# Altium footprint library Connectors.PcbLib: 67 footprints (part 1 of 5)
Each footprint in its own frame and in the unit in brackets; x right, y up, seen from the top. Pads: shape width x height; smd on the part's side, far side on the other; paste and mask are expansions set on the pad; w line width, h text height; cw(c..) or ccw(c..) is an arc to the next point about the centre after c.
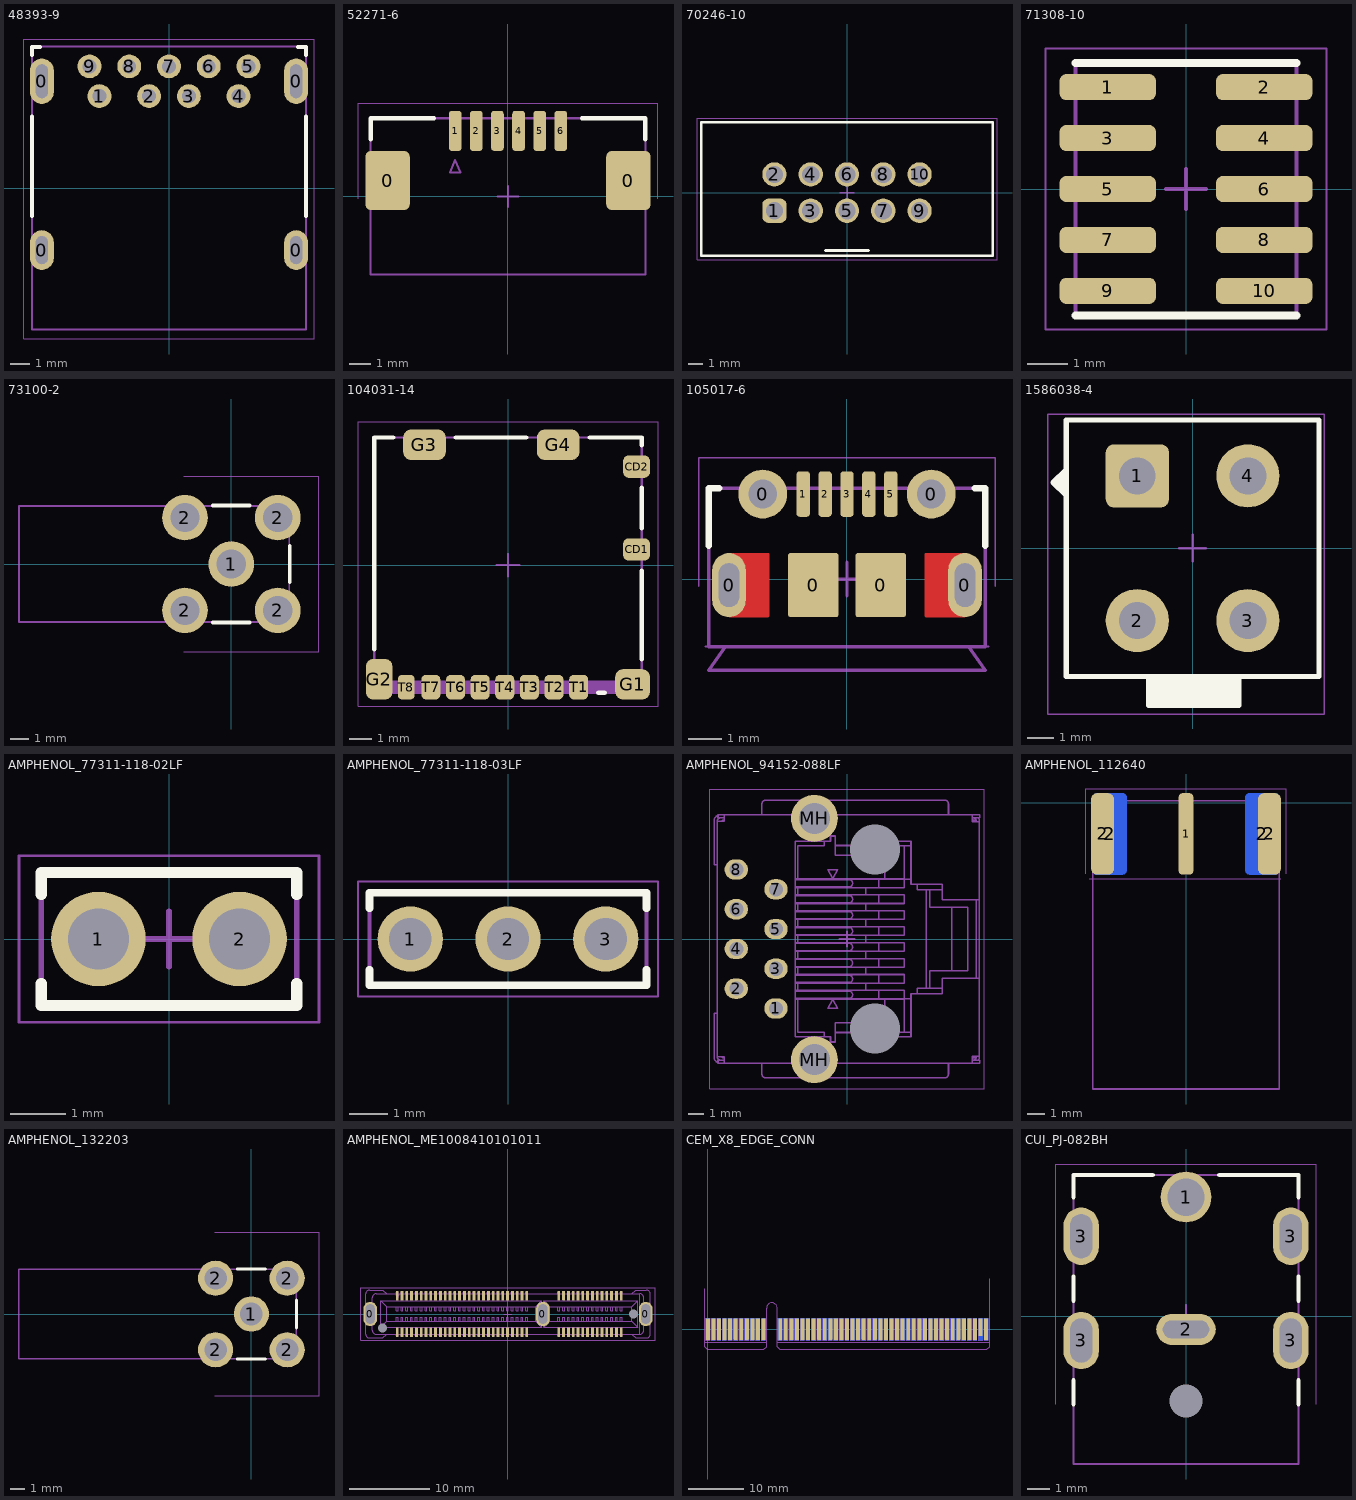
[diagram p0: the footprints below, top view; thin cyan lines are the x and y axes]

## 48393-9 [mm]
height 6.86
pads (13):
  oval 1.2x2 hole 1.4 slot 0.6 at 0 deg mask+0.05: 0(-6.4,-3.125) 0(6.4,-3.125)
  oval 1.2x2.3 hole 1.7 slot 0.6 at 0 deg mask+0.05: 0(-6.4,5.375) 0(6.4,5.375)
  round 1.2 hole 0.7 mask+0.05: 1(-3.5,4.625) 2(-1,4.625) 3(1,4.625) 4(3.5,4.625) 5(4,6.125) 6(2,6.125) 7(0,6.125) 8(-2,6.125) 9(-4,6.125)
Top Overlay:
  lines w0.2: -6.9,-1.4 -6.9,3.6 ; -6.9,6.7 -6.9,7.1 -6.5,7.1 ; 6.5,7.1 6.9,7.1 6.9,6.7 ; 6.9,-1.4 6.9,3.6
Top Assembly:
  lines w0.1: -6.9,-7.125 -6.9,7.125 6.9,7.125 6.9,-7.125 -6.9,-7.125
  text ".Designator" at -5.835,-0.571 h1.6
Top Courtyard (Mech13):
  lines w0.05: -7.3,-7.6 7.3,-7.6 7.3,7.5 -7.3,7.5 -7.3,-7.6
3D body "123.stp": height 6.5, standoff -1.54, extent -6.9,-7.125 6.9,7.125

## 52271-6 [mm]
height 3
pads (8):
  rrect25% 2.1x2.8 smd mask+0.05: 0(-5.7,0.75) 0(5.7,0.75)
  rrect50% 0.6x1.9 smd mask+0.05: 1(-2.5,3.1) 2(-1.5,3.1) 3(-0.5,3.1) 4(0.5,3.1) 5(1.5,3.1) 6(2.5,3.1)
Top Overlay:
  lines w0.2: -6.5,2.7 -6.5,3.7 -3.5,3.7 ; 3.5,3.7 6.5,3.7 6.5,2.7
Top Assembly:
  lines w0.1: -6.5,-3.7 6.5,-3.7 6.5,3.7 -6.5,3.7 -6.5,-3.7 ; -2.75,1.125 -2.5,1.725 -2.25,1.125 -2.75,1.125
  text ".Designator" at -5.835,-0.571 h1.6
Top Courtyard (Mech13):
  lines w0.05: -7.1,-0.1 -7.1,4.4 7.1,4.4 7.1,-0.1
  lines w0.1: -0.5,0 0.5,0 ; 0,-0.5 0,0.5
3D body "522710679.stp": height 3, standoff 0, extent -6.5,-3.7 6.5,3.7

## 70246-10 [mm]
height 6.1
pads (10):
  rrect50% 1.7x1.7 hole 1.2 mask+0.05: 1(-5.08,-1.27)
  round 1.7 hole 1.2 mask+0.05: 2(-5.08,1.27) 3(-2.54,-1.27) 4(-2.54,1.27) 5(0,-1.27) 6(0,1.27) 7(2.54,-1.27) 8(2.54,1.27) 9(5.08,-1.27) 10(5.08,1.27)
Top Overlay:
  lines w0.2: -1.5,-4.05 0,-4.05 1.5,-4.05 ; -10.2,-4.425 -10.2,4.925 10.2,4.925 10.2,-4.425 -10.2,-4.425
Top Assembly:
  lines w0.1: -1.5,-4.05 1.5,-4.05 ; -10.2,-4.425 -10.2,4.925 10.2,4.925 10.2,-4.425 -10.2,-4.425
  text ".Designator" at -5.835,-0.571 h1.6
Top Courtyard (Mech13):
  lines w0.05: -10.5,-4.7 -10.5,5.2 10.5,5.2 10.5,-4.7 -10.5,-4.7
  lines w0.1: -0.5,0 0.5,0 ; 0,-0.5 0,0.5
3D body "IDC-10MS.x_t": height 9.45, standoff -3.25, extent -10.2,-4.421 10.2,4.929

## 71308-10 [mm] "HARWIN, plug, 1.27 mm pitch, 10 pin"
height 4.68
pads (10):
  rrect50% 2.4x0.65 smd mask+0.05: 1(-1.95,2.54) 2(1.95,2.54) 3(-1.95,1.27) 4(1.95,1.27) 5(-1.95,0) 6(1.95,0) 7(-1.95,-1.27) 8(1.95,-1.27) 9(-1.95,-2.54) 10(1.95,-2.54)
Top Overlay:
  lines w0.2: -2.75,-3.16 2.75,-3.16 ; -2.75,3.14 2.75,3.14
Top Assembly:
  lines w0.1: 2.75,-3.16 -2.75,-3.16 -2.75,3.14 2.75,3.14 2.75,-3.16 ; 2.75,-3.16 2.75,-3.16
  text ".Designator" at -5.835,-0.571 h1.6
Top Courtyard (Mech13):
  lines w0.05: -3.5,-3.5 3.5,-3.5 3.5,3.5 -3.5,3.5 -3.5,-3.5
  lines w0.1: -0.5,0 0.5,0 ; 0,-0.5 0,0.5
3D body "M50-3600542.STEP": height 4.7, standoff 0.02, extent -2.7,-3.185 2.8,3.165

## 73100-2 [mm]
height 0.9
pads (5):
  round 2.5 hole 1.6 mask+0.05: 1(0,0) 2(-2.54,-2.54) 2(-2.54,2.54) 2(2.54,-2.54) 2(2.54,2.54)
Top Overlay:
  lines w0.2: -1,-3.2 1,-3.2 ; -1,3.2 1,3.2 ; 3.2,-1 3.2,1
Top Assembly:
  lines w0.1: -11.625,-3.175 3.175,-3.175 3.175,0 3.175,3.175 -11.6,3.175 -11.625,3.175 -11.625,-3.175
  text ".Designator" at -5.835,-0.571 h1.6
Top Courtyard (Mech13):
  lines w0.05: -2.6,-4.8 4.8,-4.8 4.8,4.8 -2.6,4.8
3D body "731000114.stp": height 9.67, standoff -3.83, extent -11.62,-3.175 3.18,3.175

## 104031-14 [mm]
height 1.42
pads (14):
  rrect50% 1.2x1 smd mask+0.05: CD1(5.74,0.7) CD2(5.74,4.4)
  rrect50% 1.55x1.35 smd mask+0.05: G1(5.565,-5.325)
  rrect50% 1.17x1.8 smd mask+0.05: G2(-5.755,-5.1)
  rrect50% 1.9x1.35 smd mask+0.05: G3(-3.73,5.375) G4(2.24,5.375)
  rrect50% 0.85x1.1 smd mask+0.05: T1(3.155,-5.45) T2(2.055,-5.45) T3(0.955,-5.45) T4(-0.145,-5.45) T5(-1.245,-5.45) T6(-2.345,-5.45) T7(-3.445,-5.45)
  rrect50% 0.75x1.1 smd mask+0.05: T8(-4.545,-5.45)
Top Overlay:
  lines w0.2: -5.975,-3.75 -5.975,5.7 -5.125,5.7 ; -2.325,5.7 0.825,5.7 ; 3.65,5.7 5.975,5.7 5.975,5.35 ; 4.025,-5.7 4.325,-5.7 ; 5.975,-4.2 5.975,-0.25 ; 5.975,1.65 5.975,3.45
Top Assembly:
  region: 5.975,-5.2 5.975,-5.7 -5.975,-5.7 -5.975,-5.2
  lines w0.1: -5.975,-5.2 5.975,-5.2 ; -5.975,-5.7 5.975,-5.7 5.975,5.7 -5.975,5.7 -5.975,-5.7
  text ".Designator" at -5.835,-0.571 h1.6
Top Courtyard (Mech13):
  lines w0.05: -6.7,-6.3 -6.7,6.4 6.7,6.4 6.7,-6.3 -6.7,-6.3
  lines w0.1: -0.5,0 0.5,0 ; 0,-0.5 0,0.5
3D body "_1040310811.STEP": height 1.44, standoff -0.01, extent -5.975,-5.7 5.975,5.7

## 105017-6 [mm] "Molex"
height 2.9
pads (11):
  oval 1x1.9 hole 1.3 slot 0.6 at 0 deg mask+0.05: 0(-3.5,-0.175) 0(3.5,-0.175)
  round 1.45 hole 0.85 mask+0.05: 0(-2.5,2.525) 0(2.5,2.525)
  rrect10% 1.5x1.9 smd mask+0.05: 0(-1,-0.175) 0(1,-0.175)
  rrect50% 0.4x1.35 smd mask+0.05: 1(-1.3,2.525) 2(-0.65,2.525) 3(0,2.525) 4(0.65,2.525) 5(1.3,2.525)
Top Layer:
  region: 3.5,0.775 2.35,0.775 2.34,0.775 2.322,0.767 2.308,0.753 2.3,0.735 2.3,0.725 2.3,-1.075 2.3,-1.085 2.308,-1.103 2.322,-1.117 2.34,-1.125 2.35,-1.125 3.5,-1.125
  region: -3.5,0.775 -2.35,0.775 -2.34,0.775 -2.322,0.767 -2.308,0.753 -2.3,0.735 -2.3,0.725 -2.3,-1.075 -2.3,-1.085 -2.308,-1.103 -2.322,-1.117 -2.34,-1.125 -2.35,-1.125 -3.5,-1.125
Top Overlay:
  lines w0.2: -4.1,1 -4.1,2.7 -3.8,2.7 ; 3.8,2.7 4.1,2.7 4.1,1
Board:
  lines w0.05: -4.2,-2 4.2,-2
Top Assembly:
  lines w0.1: -3.6,-2 3.6,-2 ; -3.6,-2 -4.1,-2.7 4.1,-2.7 3.6,-2 ; -3.6,-2 -4.1,-2 -4.1,2.7 4.1,2.7 4.1,-2 3.6,-2
  text ".Designator" at -5.835,-0.571 h1.6
Top Courtyard (Mech13):
  lines w0.05: -4.4,-0.2 -4.4,3.6 4.4,3.6 4.4,-0.2
  lines w0.1: -0.5,0 0.5,0 ; 0,-0.5 0,0.5
3D body "1050170001.stp": height 2.66, standoff -0.64, extent -4.1,-2.7 4.1,2.7

## 1586038-4 [mm]
height 12.8
pads (4):
  rrect25% 2.4x2.4 hole 1.4 mask+0.05: 1(-2.1,2.75)
  round 2.4 hole 1.4 mask+0.05: 2(-2.1,-2.75) 3(2.1,-2.75) 4(2.1,2.75)
Top Overlay:
  region: -4.8,3 -5.3,2.5 -4.8,2
  region: -1.675,-4.875 -1.675,-5.975 1.75,-5.975 1.75,-4.875
  lines w0.2: -4.8,2 -5.3,2.5 -4.8,3 ; -1.675,-4.875 -1.675,-5.975 1.75,-5.975 1.75,-4.875 ; -4.8,-4.875 4.8,-4.875 4.8,4.875 -4.8,4.875 -4.8,-4.875
Top Assembly:
  region: -4.8,3 -5.3,2.5 -4.8,2
  region: -1.675,-4.875 -1.675,-5.975 1.75,-5.975 1.75,-4.875
  lines w0.1: -4.8,2 -5.3,2.5 -4.8,3 ; -1.675,-4.875 -1.675,-5.975 1.75,-5.975 1.75,-4.875 ; -4.8,-4.875 -4.8,4.875 4.8,4.875 4.8,-4.875 -4.8,-4.875
  text ".Designator" at -5.835,-0.571 h1.6
Top Courtyard (Mech13):
  lines w0.05: -5.5,-6.3 5,-6.3 5,5.1 -5.5,5.1 -5.5,-6.3
  lines w0.1: -0.5,0 0.5,0 ; 0,-0.5 0,0.5
3D body "c-1586038-4-c-3d.stp": height 12.8, standoff -3.5, extent -5.3,-6.075 4.8,4.875

## AMPHENOL_77311-118-02LF [mm]
pads (2):
  round 1.7 hole 1.1 mask+0.05: 1(-1.27,0) 2(1.27,0)
Top Overlay:
  lines w0.2: -2.3,-0.8 -2.3,-1.2 2.3,-1.2 2.3,-0.8 ; -2.3,0.8 -2.3,1.2 2.3,1.2 2.3,0.8
Top Assembly:
  lines w0.1: -2.3,-1.2 -2.3,1.2 2.3,1.2 2.3,-1.2 -2.3,-1.2
  text ".Designator" at -5.835,-0.571 h1.6
Top Courtyard (Mech13):
  lines w0.05: -2.7,-1.5 2.7,-1.5 2.7,1.5 -2.7,1.5 -2.7,-1.5
  lines w0.1: -0.5,0 0.5,0 ; 0,-0.5 0,0.5
3D body "77311-y18-02_asm.stp": height 8.38, standoff -3.12, extent -2.34,-1.205 2.34,1.205

## AMPHENOL_77311-118-03LF [mm]
pads (3):
  round 1.7 hole 1.1 mask+0.05: 1(-2.54,0) 2(0,0) 3(2.54,0)
Top Overlay:
  lines w0.2: -3.6,-0.8 -3.6,-1.2 3.6,-1.2 3.6,-0.8 ; -3.6,0.8 -3.6,1.2 3.6,1.2 3.6,0.8
Top Assembly:
  lines w0.1: -3.6,-1.2 3.6,-1.2 3.6,1.2 -3.6,1.2 -3.6,-1.2
  text ".Designator" at -5.835,-0.571 h1.6
Top Courtyard (Mech13):
  lines w0.05: -3.9,-1.5 -3.9,1.5 3.9,1.5 3.9,-1.5 -3.9,-1.5
  lines w0.1: -0.5,0 0.5,0 ; 0,-0.5 0,0.5
3D body "77311-y18-03_asm.stp": height 8.38, standoff -3.12, extent -3.61,-1.205 3.61,1.205

## AMPHENOL_94152-088LF [mm]
pads (12):
  oval 1.5x1.3 hole 0.9 mask+0.05: 1(-4.545,-4.445) 2(-7.085,-3.175) 3(-4.545,-1.905) 4(-7.085,-0.635) 5(-4.545,0.635) 6(-7.085,1.905) 7(-4.545,3.175) 8(-7.085,4.445)
  round 3 hole 2: MH(-2.085,-7.72) MH(-2.085,7.72)
  round 0 hole 3.2 unplated: MH(1.805,-5.715) MH(1.805,5.715)
Top Assembly:
  drawing of 317 lines, arcs and shapes, not listed
  text ".Designator" at -5.835,-0.571 h1.6
Top Courtyard (Mech13):
  lines w0.05: -8.8,-9.6 -8.8,9.6 8.8,9.6 8.8,-9.6 -8.8,-9.6
  lines w0.1: -0.5,0 0.5,0 ; 0,-0.5 0,0.5
3D body "94152-088LFc.stp": height 15.82, standoff -3.49, extent -8.505,-8.89 8.505,8.89

## AMPHENOL_112640 [mm]
pads (5):
  rrect50% 0.86x4.8 smd: 1(0,-1.85)
  rrect50% 1.35x4.8 smd: 2(-4.925,-1.85) 2(4.925,-1.85)
  rrect25% 2x4.8 smd far side: 2(-4.5,-1.85) 2(4.5,-1.85)
Board:
  lines w0.05: -5.7,-4.5 5.6,-4.5
Top Assembly:
  lines w0.1: -5.5,-16.9 5.5,-16.9 5.5,0.1 -5.5,0.1 -5.5,-16.9
  text ".Designator" at 0.571,-5.835 h1.6
Top Courtyard (Mech13):
  lines w0.05: -5.9,-4.2 -5.9,0.8 5.9,0.8 5.9,-4.2
3D body "112640_.x_t": height 5.88, standoff -5.12, extent -5.5,-16.9 5.5,0.07

## AMPHENOL_132203 [mm]
pads (5):
  round 2.5 hole 1.6 mask+0.05: 1(0,0) 2(-2.54,-2.54) 2(-2.54,2.54) 2(2.54,-2.54) 2(2.54,2.54)
Top Overlay:
  lines w0.2: -1,-3.2 1,-3.2 ; -1,3.2 1,3.2 ; 3.2,-1 3.2,1
Top Assembly:
  lines w0.1: -16.5,-3.175 3.175,-3.175 3.175,0 3.175,3.175 -11.6,3.175 -16.5,3.175 -16.5,-3.175
  text ".Designator" at -5.835,-0.571 h1.6
Top Courtyard (Mech13):
  lines w0.05: -2.6,-5.8 4.8,-5.8 4.8,5.8 -2.6,5.8
3D body "132203.stp": height 11.61, standoff -3.79, extent -16.5,-5.105 4,5.105

## AMPHENOL_ME1008410101011 [mm]
pads (89):
  oval 1.7x3.05 hole 1.1 slot 2.45 at 90 deg mask+0.1: 0(-17.223,0) 0(4.357,0) 0(17.227,0)
  rrect25% 0.35x1.2 smd mask+0.05: A1(-13.853,2.3) A2(-13.253,2.3) A3(-12.653,2.3) A4(-12.053,2.3) A5(-11.453,2.3) A6(-10.853,2.3) A7(-10.253,2.3) A8(-9.653,2.3) A9(-9.053,2.3) A10(-8.453,2.3) A11(-7.853,2.3) A12(-7.253,2.3) A13(-6.653,2.3) A14(-6.053,2.3) A15(-5.453,2.3) A16(-4.853,2.3) A17(-4.253,2.3) A18(-3.653,2.3) A19(-3.053,2.3) A20(-2.453,2.3) A21(-1.853,2.3) A22(-1.253,2.3) A23(-0.653,2.3) A24(-0.053,2.3) A25(0.547,2.3) A26(1.147,2.3) A27(1.747,2.3) A28(2.347,2.3) A29(6.357,2.3) A30(6.957,2.3) A31(7.557,2.3) A32(8.157,2.3) A33(8.757,2.3) A34(9.357,2.3) A35(9.957,2.3) A36(10.557,2.3) A37(11.157,2.3) A38(11.757,2.3) A39(12.357,2.3) A40(12.957,2.3) A41(13.557,2.3) A42(14.157,2.3) B1(-13.853,-2.3) B2(-13.253,-2.3) B3(-12.653,-2.3) B4(-12.053,-2.3) B5(-11.453,-2.3) B6(-10.853,-2.3) B7(-10.253,-2.3) B8(-9.653,-2.3) B9(-9.053,-2.3) B10(-8.453,-2.3) B11(-7.853,-2.3) B12(-7.253,-2.3) B13(-6.653,-2.3) B14(-6.053,-2.3) B15(-5.453,-2.3) B16(-4.853,-2.3) B17(-4.253,-2.3) B18(-3.653,-2.3) B19(-3.053,-2.3) B20(-2.453,-2.3) B21(-1.853,-2.3) B22(-1.253,-2.3) B23(-0.653,-2.3) B24(-0.053,-2.3) B25(0.547,-2.3) B26(1.147,-2.3) B27(1.747,-2.3) B28(2.347,-2.3) B29(6.357,-2.3) B30(6.957,-2.3) B31(7.557,-2.3) B32(8.157,-2.3) B33(8.757,-2.3) B34(9.357,-2.3) B35(9.957,-2.3) B36(10.557,-2.3) B37(11.157,-2.3) B38(11.757,-2.3) B39(12.357,-2.3) B40(12.957,-2.3) B41(13.557,-2.3) B42(14.157,-2.3)
  round 0 hole 1.1 unplated mask+0.1: MH(-15.673,-1.75) MH(15.673,0)
Top Assembly:
  drawing of 722 lines, arcs and shapes, not listed
  text ".Designator" at -5.835,-0.571 h1.6
Top Courtyard (Mech13):
  lines w0.05: -18.4,-3.3 18.4,-3.3 18.4,3.3 -18.4,3.3 -18.4,-3.3
  lines w0.1: -0.5,0 0.5,0 ; 0,-0.5 0,0.5
3D body "2c.stp": height 9.1, standoff -1.85, extent -17.8,-3 17.8,3

## CEM_X8_EDGE_CONN [mm]
pads (98):
  rrect25% 0.7x3.2 smd far side paste-1 mask+0.1: A1(0,0.35)
  rrect25% 0.7x3.9 smd far side paste-1 mask+0.1: A2(1,0) A3(2,0) A4(3,0) A5(4,0) A6(5,0) A7(6,0) A8(7,0) A9(8,0) A10(9,0) A11(10,0) A12(13,0) A13(14,0) A14(15,0) A15(16,0)
  rrect25% 0.7x3.9 smd far side: A16(17,0) A17(17.999,0) A18(19,0) A19(20,0) A20(20.999,0) A21(22,0) A22(22.999,0) A23(24,0) A24(25,0) A25(25.999,0) A26(27,0) A27(27.999,0) A28(29,0) A29(30,0) A30(30.999,0) A31(32,0) A32(32.999,0) A33(34,0) A34(35,0) A35(35.999,0) A36(37,0) A37(37.999,0) A38(39,0) A39(40,0) A40(40.999,0) A41(42,0) A42(42.999,0) A43(44,0) A44(45,0) A45(45.999,0) A46(47,0) A47(47.999,0) A48(49,0) A49(50,0)
  rrect25% 0.7x3.9 smd paste-1 mask+0.1: B1(0,0) B2(1,0) B3(2,0) B4(3,0) B5(4,0) B6(5,0) B7(6,0) B8(7,0) B9(8,0) B10(9,0) B11(10,0) B12(13,0) B13(14,0) B14(15,0) B15(16,0)
  rrect25% 0.7x3.9 smd: B16(17,0) B17(17.999,0) B18(19,0) B19(20,0) B20(20.999,0) B21(22,0) B22(22.999,0) B23(24,0) B24(25,0) B25(25.999,0) B26(27,0) B27(27.999,0) B28(29,0) B29(30,0) B30(30.999,0) B31(32,0) B32(32.999,0) B33(34,0) B34(35,0) B35(35.999,0) B36(37,0) B37(37.999,0) B38(39,0) B39(40,0) B40(40.999,0) B41(42,0) B42(42.999,0) B43(44,0) B44(45,0) B45(45.999,0) B46(47,0) B47(47.999,0) B49(50,0)
  rrect25% 0.7x3.2 smd: B48(49,0.35)
Top Solder:
  region: 12.45,2.35 12.45,-3.15 12.95,-3.65 50.15,-3.65 50.65,-3.15 50.65,2.35
  region: -0.6,2.35 -0.6,-3.15 -0.1,-3.65 10.05,-3.65 10.55,-3.15 10.55,2.35
Bottom Solder:
  region: -0.6,2.35 -0.6,-3.15 -0.1,-3.65 10.05,-3.65 10.55,-3.15 10.55,2.35
  region: 12.45,2.35 12.45,-3.15 12.95,-3.65 50.15,-3.65 50.65,-3.15 50.65,2.35
Top Assembly:
  drawing of 213 lines, arcs and shapes, not listed
  text "B49" at -2.866,-1.7 h1.6
  text "B1" at -1.933,-1.7 h1.6
  text ".Designator" at -5.835,-0.571 h1.6
Bottom Assembly:
  drawing of 213 lines, arcs and shapes, not listed
  text "B49" at 50.4,2.316 h1.4
  text "A1" at 0.925,2.3 h1.4

## CUI_PJ-082BH [mm]
height 10
pads (7):
  round 2.3 hole 1.7 mask+0.05: 1(0,5.4)
  oval 2.7x1.4 hole 0.8 slot 2.1 at 0 deg mask+0.05: 2(0,-0.6)
  oval 1.6x2.6 hole 1 slot 2 at 90 deg mask+0.05: 3(-4.75,-1.1) 3(-4.75,3.625) 3(4.75,-1.1) 3(4.75,3.625)
  round 0 hole 1.5 unplated mask+0.05: MH(0,-3.85)
Top Overlay:
  lines w0.2: -5.1,-4 -5.1,-2.9 ; -5.1,0.7 -5.1,1.8 ; -5.1,5.4 -5.1,6.4 -1.5,6.4 ; 1.5,6.4 5.1,6.4 5.1,5.4 ; 5.1,-4 5.1,-2.9 ; 5.1,0.7 5.1,1.8
Top Assembly:
  lines w0.1: -5.1,-6.7 5.1,-6.7 5.1,6.4 -5.1,6.4 -5.1,-6.7
  text ".Designator" at -5.835,-0.571 h1.6
Top Courtyard (Mech13):
  lines w0.05: -5.9,-4 -5.9,6.9 5.9,6.9 5.9,-4
  lines w0.1: -0.5,0 0.5,0 ; 0,-0.5 0,0.5
3D body "CUI_DEVICES_PJ-082BH.step": height 9.95, standoff -2.25, extent -5.1,-6.727 5.1,6.403